# Altium footprint library EnerfiLib.PcbLib: 26 footprints (part 2 of 2)
Each footprint in its own frame and in the unit in brackets; x right, y up, seen from the top. Pads: shape width x height; smd on the part's side, far side on the other; paste and mask are expansions set on the pad; w line width, h text height; cw(c..) or ccw(c..) is an arc to the next point about the centre after c.
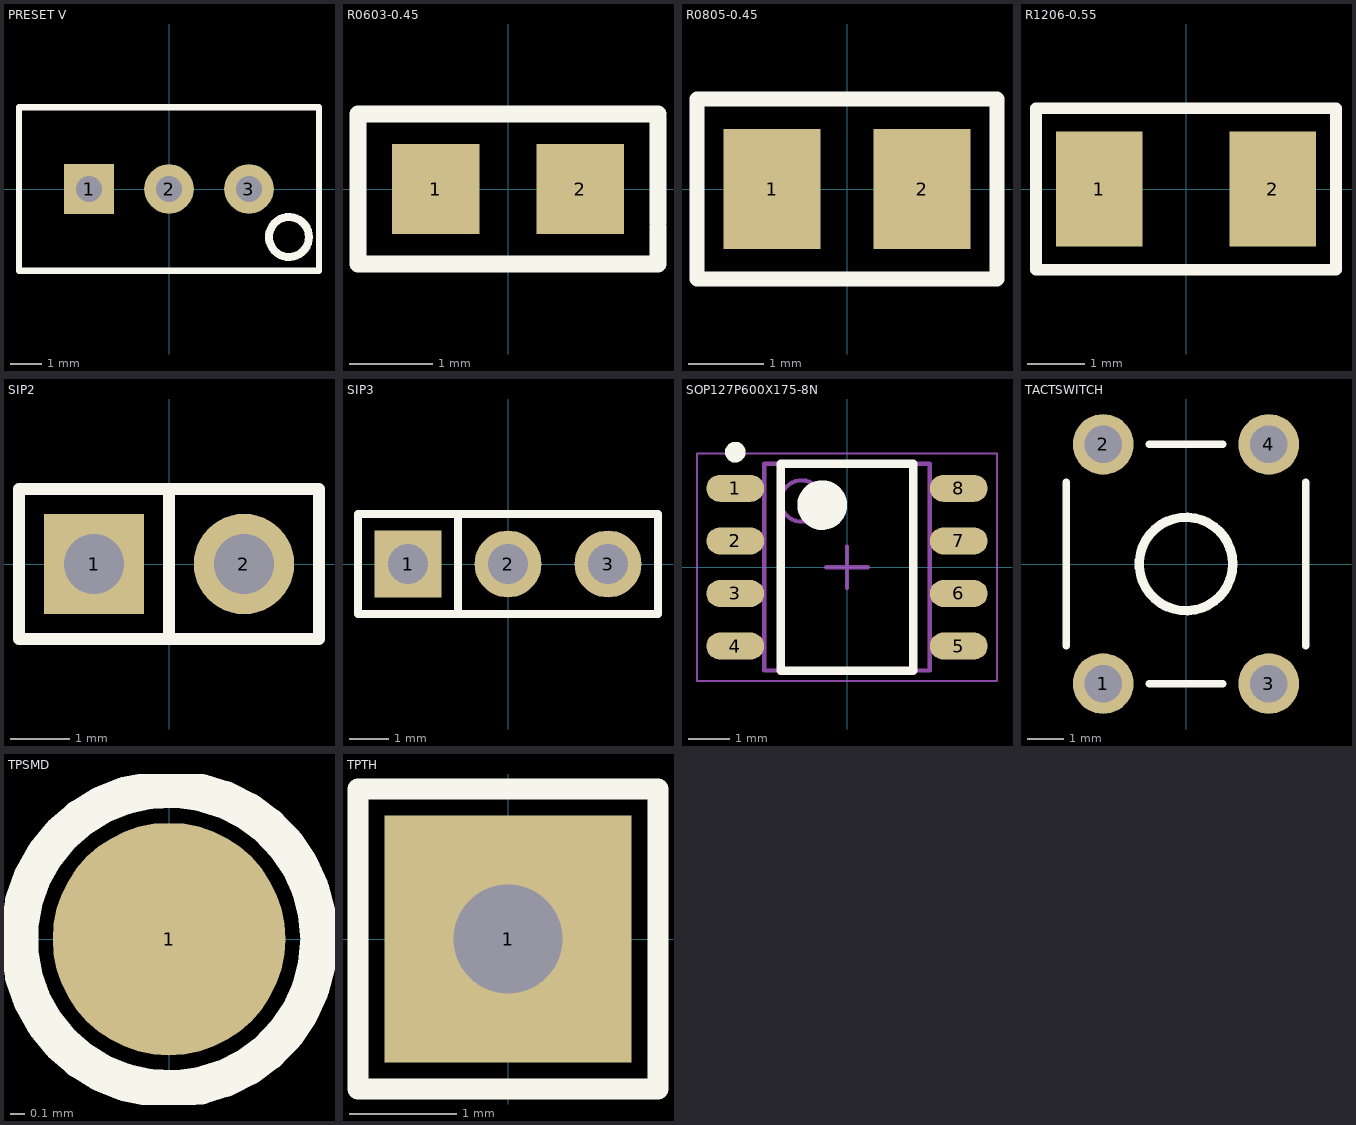
[diagram p1: the footprints below, top view; thin cyan lines are the x and y axes]

## PRESET V [mil]
pads (3):
  rect 62x62 hole 32: 1(-100,0)
  round 62 hole 32: 2(0,0) 3(100,0)
Top Overlay:
  circle w10: c150,-60 r25
  lines w7.87: -187.5,-102.36 -187.5,102.36 187.5,102.36 187.5,-102.36 -187.5,-102.36
3D body "Preset.step": height 454.72, standoff -251.97, extent -185.2,-95.1 190,95.1

## R0603-0.45 [mm] "Resistor Chip 0603 Height 0.45mm"
height 0.45
pads (2):
  rect 1.05x1.08 smd: 1(-0.865,0) 2(0.865,0)
Top Overlay:
  lines w0.2: 1.8,-0.45 1.8,-0.9 -1.8,-0.9 -1.8,0.9 1.8,0.9 ; 1.8,-0.4 1.8,0.5 ; 1.8,0.4 1.8,0.85
3D body "R0603-0.45.step": height 0.46, standoff 0, extent -0.8,-0.4 0.8,0.4

## R0805-0.45 [mm] "Resistor Chip 0805 Height 0.45mm"
height 0.45
pads (2):
  rect 1.3x1.6 smd: 1(-1,0) 2(1,0)
Top Overlay:
  lines w0.2: -2,-0.7 -2,1.2 2,1.2 2,-1.2 -2,-1.2 -2,-0.65
3D body "R0805-0.45.step": height 0.46, standoff 0, extent -1,-0.625 1,0.625

## R1206-0.55 [mm] "Resistor Chip 1206 Height 0.55mm"
height 0.55
pads (2):
  rect 1.5x2 smd: 1(-1.5,0) 2(1.5,0)
Top Overlay:
  lines w0.2: -2.6,-1.4 -0.5,-1.4 0.9,-1.4 1.3,-1.4 2.6,-1.4 2.6,1.4 -2.6,1.4 -2.6,0.2 -2.6,-1.4
3D body "R1206-0.55.step": height 0.56, standoff 0, extent -1.6,-0.8 1.6,0.8

## SIP2 [mm]
pads (2):
  rect 1.7x1.7 / inner rect 1.7x1.5 / far side rect 1.7x1.5 hole 1.016: 1(-1.27,0)
  round 1.7 / inner oval 1.7x1.5 / far side oval 1.7x1.5 hole 1.016: 2(1.27,0)
Top Overlay:
  lines w0.2: 0,-1.27 0,1.27 ; -2.54,-1.27 2.54,-1.27 2.54,1.27 -2.54,1.27 -2.54,-1.27
3D body "User Library-HEADER2.STEP": height 9, standoff -2, extent -2.489,-1.27 2.591,1.27

## SIP3 [mm]
pads (3):
  rect 1.7x1.7 hole 1.016: 1(-2.54,0)
  round 1.7 hole 1.016: 2(0,0) 3(2.54,0)
Top Overlay:
  lines w0.2: -1.27,-1.27 -1.27,1.27 ; -3.81,-1.27 3.81,-1.27 3.81,1.27 -3.81,1.27 -3.81,-1.27
3D body "SIP3.step": height 8.38, standoff -2.54, extent -3.81,-1.295 3.81,1.245

## SOP127P600X175-8N [mm] "SOP, 8-Leads, Body 4,95x3,95mm, Pitch 1,27mm, IPC Medium Density"
height 1.75
pads (8):
  oval 1.4x0.65 smd: 1(-2.7,1.905) 2(-2.7,0.635) 3(-2.7,-0.635) 4(-2.7,-1.905) 5(2.7,-1.905) 6(2.7,-0.635) 7(2.7,0.635) 8(2.7,1.905)
Top Overlay:
  circle w0.25: c-2.7,2.78 r0.125
  circle w0.6: c-0.6,1.5 r0.3
  lines w0.2: -1.6,-2.5 -1.6,2.5 1.6,2.5 1.6,-2.5 -1.6,-2.5
Mechanical 13:
  circle w0.1: c-1.1,1.6 r0.5
  lines w0.1: -2,-2.5 -2,2.5 2,2.5 2,-2.5 -2,-2.5
Mechanical 15:
  lines w0.05: -3.625,-2.75 -3.625,2.75 3.625,2.75 3.625,-2.75 -3.625,-2.75
  lines w0.1: -0.5,0 0.5,0 ; 0,-0.5 0,0.5
3D body "SOP127P600X175-8N.step": height 1.75, standoff 0, extent -2.975,-2.5 2.975,2.5

## TACTSWITCH [mil]
pads (4):
  round 65 hole 40: 1(-88.58,-127.95) 2(-88.58,127.95) 3(88.58,-127.95) 4(88.58,127.95)
Top Overlay:
  circle w10: c0,0 r50
  lines w7.87: -128.11,-87.48 -128.11,87.52 ; -39.37,-128.11 39.37,-128.11 ; -39.37,128.11 39.37,128.11 ; 128.11,-87.52 128.11,87.48
3D body "TACTSWITCH.step": height 275.59, standoff -137.8, extent -120,-155.51 124.09,155.51

## TPSMD [mil]
pads (1):
  round 62 smd: 1(0,0)
Top Overlay:
  circle w10: c0,0 r40

## TPTH [mm]
pads (1):
  rect 2.3x2.3 hole 1.016: 1(0,0)
Top Overlay:
  lines w0.2: -1.397,-1.397 -1.397,1.397 1.397,1.397 1.397,-1.397 -1.397,-1.397
3D body "User Library-Header Vertical 2_54mm Pitch2-1.step": height 6.04, standoff -2.84, extent -1.27,-1.27 1.27,1.27